# Altium footprint library Library.PcbLib: 298 footprints (part 4 of 19)
Each footprint in its own frame and in the unit in brackets; x right, y up, seen from the top. Pads: shape width x height; smd on the part's side, far side on the other; paste and mask are expansions set on the pad; w line width, h text height; cw(c..) or ccw(c..) is an arc to the next point about the centre after c.
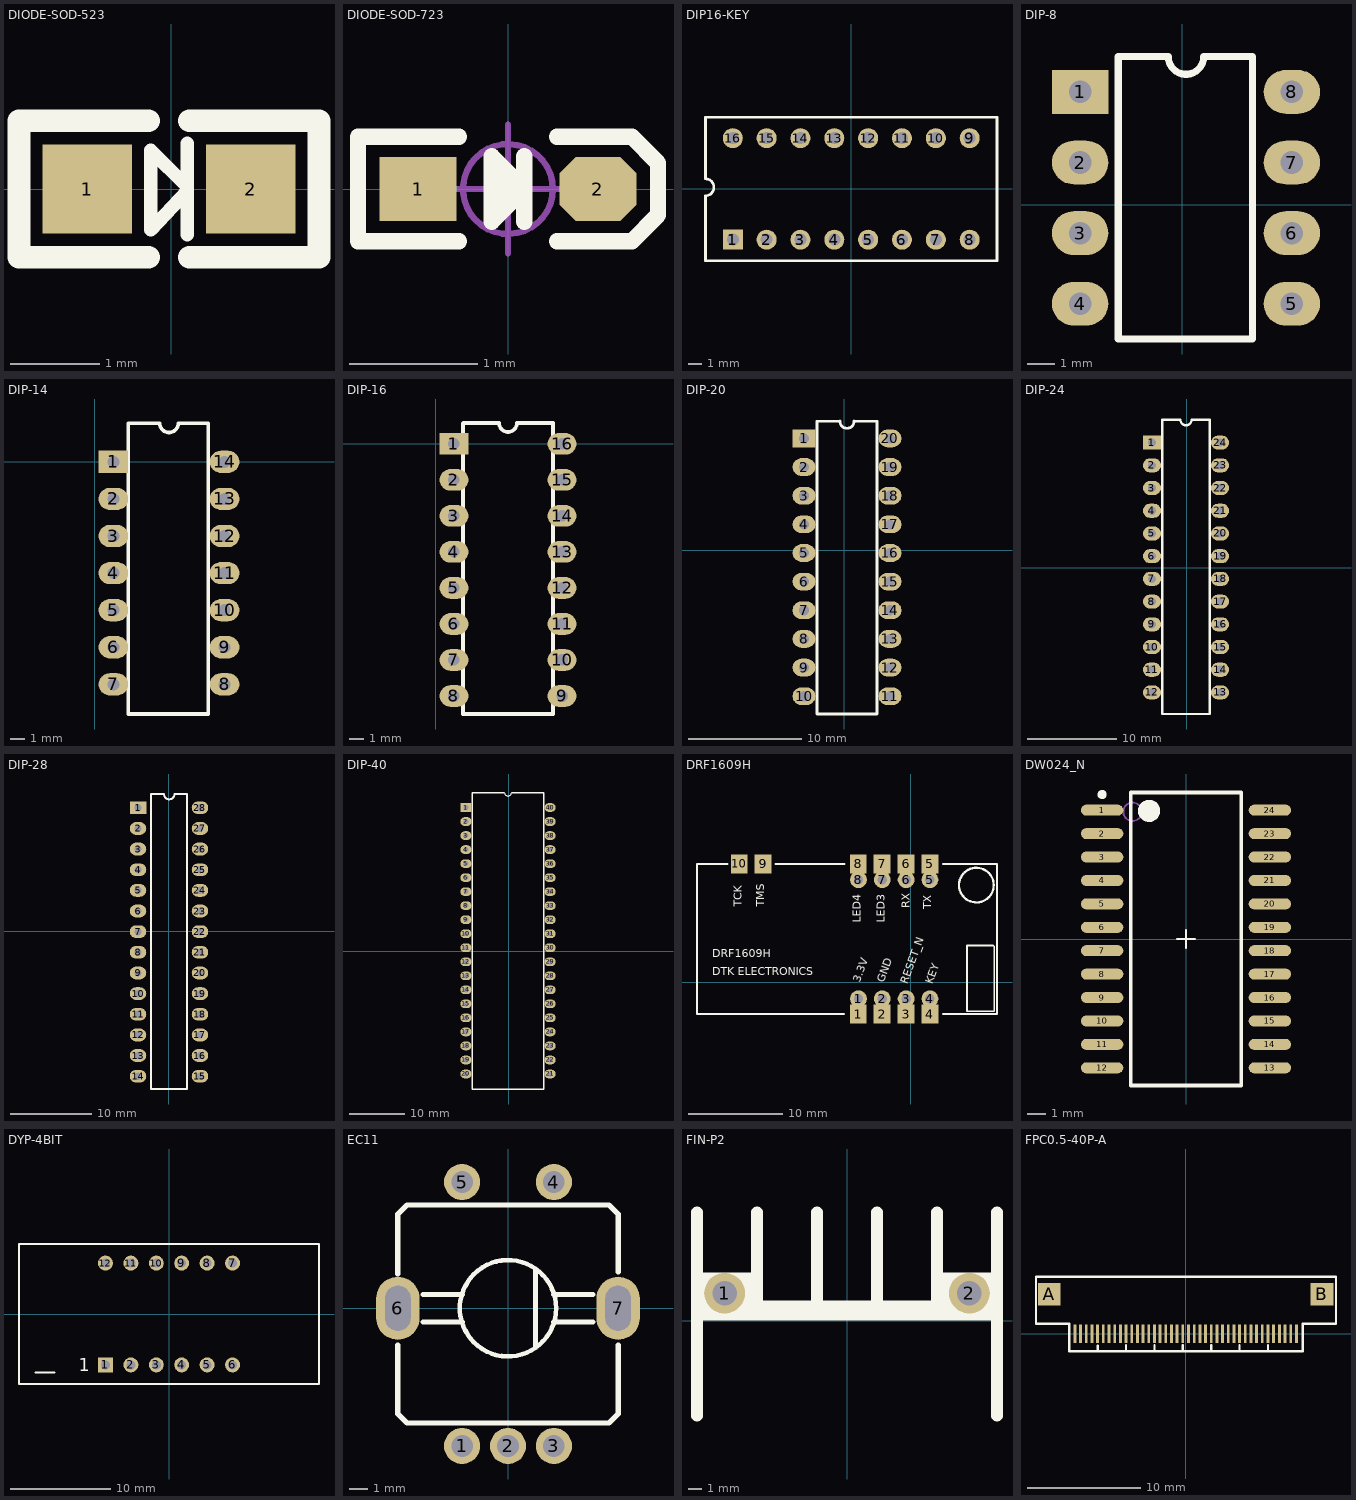
[diagram p3: the footprints below, top view; thin cyan lines are the x and y axes]

## DIODE-SOD-523 [mm] "0603"
pads (2):
  rect 1x1 smd: 1(-0.94,0) 2(0.889,0)
Top Overlay:
  lines w0.152: 0.178,-0.508 0.178,0.508 ; 0.178,-0.025 -0.229,-0.457 -0.229,0.432 0.178,0.025
  lines w0.254: -0.254,-0.762 -1.702,-0.762 -1.702,0.762 -0.254,0.762 ; 0.203,-0.762 1.651,-0.762 1.651,0.762 0.203,0.762
3D body "SOD-523.STEP": height 0.65, standoff 0, extent -0.813,-0.381 0.787,0.419

## DIODE-SOD-723 [mm]
pads (2):
  rect 0.6x0.5 smd: 1(-0.7,0)
  oct 0.6x0.5 smd: 2(0.7,0)
Top Overlay:
  lines w0.127: -0.381,-0.406 -1.168,-0.406 -1.168,0.406 -0.381,0.406 ; 0,-0.127 0,0.127 -0.127,0.254 ; 0.127,-0.254 0.127,0.254 ; 0.381,-0.406 0.965,-0.406 1.168,-0.203 1.168,0.203 0.965,0.406 0.381,0.406 ; -0.127,0.254 -0.127,-0.254 0.127,0 -0.127,0.254
Mechanical 15:
  circle w0.05: c0,0 r0.35
  lines w0.05: -0.5,0 0.5,0 ; 0,-0.5 0,0.5
3D body "SOD-723.STEP": height 0.53, standoff 0.03, extent -0.7,-0.3 0.7,0.3

## DIP16-KEY [mm] "DIP拨码开关"
height 2.65
pads (16):
  rect 1.5x1.5 hole 0.9: 1(-8.89,-3.81)
  round 1.5 hole 0.9: 2(-6.35,-3.81) 3(-3.81,-3.81) 4(-1.27,-3.81) 5(1.27,-3.81) 6(3.81,-3.81) 7(6.35,-3.81) 8(8.89,-3.81) 9(8.89,3.81) 10(6.35,3.81) 11(3.81,3.81) 12(1.27,3.81) 13(-1.27,3.81) 14(-3.81,3.81) 15(-6.35,3.81) 16(-8.89,3.81)
Top Overlay:
  lines w0.2: -10.94,0.76 cw(c-10.94,0.125) -10.94,-0.51 -10.94,-5.4 10.94,-5.4 10.94,5.39 -10.94,5.39 -10.94,0.79

## DIP-8 [mil]
pads (8):
  rect 80x62 / inner rect 100x50 / far side rect 80x62 hole 32: 1(-144.37,159.75)
  oval 80x62 / inner oval 100x50 / far side oval 80x62 hole 32: 2(-144.37,59.75) 3(-144.37,-40.25) 4(-144.37,-140.25) 5(155.63,-140.25) 6(155.63,-40.25) 7(155.63,59.75) 8(155.63,159.75)
Top Overlay:
  lines w10: -90.37,-190.25 -90.37,209.75 -19.37,209.75 ccw(c5.63,209.75) 30.63,209.75 99.63,209.75 99.63,-190.25 -90.37,-190.25
3D body "P0008A.stp": height 147.5, standoff -150.77, extent -157.36,-174.75 165.63,190.25

## DIP-14 [mil]
pads (14):
  rect 80x60 hole 32: 1(50,0)
  oval 80x60 hole 32: 2(50,-100) 3(50,-200) 7(50,-600) 8(350,-600) 9(350,-500) 10(350,-400) 11(350,-300) 12(350,-200) 13(350,-100) 14(350,0)
  oval 80x60 / inner oval 100x50 / far side oval 80x62 hole 32: 4(50,-300) 5(50,-400) 6(50,-500)
Top Overlay:
  lines w10: 175,102 173,104 90,104 90,-680 306,-680 306,104 225,104 cw(c200,104) 175,104
3D body "SW3dPS-DIP14-300.STEP": height 200, standoff -98.03, extent 50.16,-675.86 360,91.86

## DIP-16 [mil]
pads (16):
  rect 80x60 / inner rect 100x50 / far side rect 80x60 hole 32: 1(50,0)
  oval 80x60 / inner oval 100x50 / far side oval 80x60 hole 32: 2(50,-100) 3(50,-200) 4(50,-300) 5(50,-400) 6(50,-500) 7(50,-600) 8(50,-700) 9(350,-700) 10(350,-600) 11(350,-500) 12(350,-400) 13(350,-300) 14(350,-200) 15(350,-100) 16(350,0)
Top Overlay:
  lines w10: 174,58 76,58 75,57 75,-750 325,-750 325,58 ; 175,58 ccw(c200,58) 225,58 ; 226,58 324,58
3D body "SW3dPS-DIP16-300.STEP": height 200, standoff -98.03, extent 42.16,-743.7 352,43.7

## DIP-20 [mil]
pads (20):
  rect 80x62 hole 35.43: 1(-141,390)
  oval 80x62 hole 35.43: 2(-141,290) 3(-141,190) 4(-141,90) 5(-141,-10) 6(-141,-110) 7(-141,-210) 8(-141,-310) 9(-141,-410) 10(-141,-510) 11(159,-510) 12(159,-410) 13(159,-310) 14(159,-210) 15(159,-110) 16(159,-10) 17(159,90) 18(159,190) 19(159,290) 20(159,390)
Top Overlay:
  lines w10: -16,450 -95.33,450 -95.33,-572 113.33,-572 113.33,450 34,450 ; -16,450.13 ccw(c9,450.13) 34,450.13
3D body "User Library-DIP20-300-metric.STEP": height 177.17, standoff -137.8, extent -140.77,-565.87 164.77,442

## DIP-24 [mil]
pads (24):
  rect 80x62 hole 35.43: 1(-153,551)
  oval 80x62 hole 35.43: 2(-153,451) 3(-153,351) 4(-153,251) 5(-153,151) 6(-153,51) 7(-153,-49) 8(-153,-149) 9(-153,-249) 10(-153,-349) 11(-153,-449) 12(-153,-549) 13(147,-549) 14(147,-449) 15(147,-349) 16(147,-249) 17(147,-149) 18(147,-49) 19(147,51) 20(147,151) 21(147,251) 22(147,351) 23(147,451) 24(147,551)
Top Overlay:
  lines w10: -107.33,652 -107.33,-644 102,-644 102,652 22,652 cw(c-3,652) -28,652 -106,652
3D body "SW3dPS-DIP24-300.STEP": height 200, standoff -98.03, extent -158,-634.08 151.84,636

## DIP-28 [mil]
pads (28):
  rect 80x62 hole 35.43: 1(-148,598)
  oval 80x62 hole 35.43: 2(-148,498) 3(-148,398) 4(-148,298) 5(-148,198) 6(-148,98) 7(-148,-2) 8(-148,-102) 9(-148,-202) 10(-148,-302) 11(-148,-402) 12(-148,-502) 13(-148,-602) 14(-148,-702) 15(152,-702) 16(152,-602) 17(152,-502) 18(152,-402) 19(152,-302) 20(152,-202) 21(152,-102) 22(152,-2) 23(152,98) 24(152,198) 25(152,298) 26(152,398) 27(152,498) 28(152,598)
Top Overlay:
  lines w10: -23,664 -85.6,664 -85.6,-764 89.6,-764 89.6,662.4 88,664 28,664 cw(c3,664) -22,664
3D body "SW3dPS-DIP28-300.STEP": height 200, standoff -98.03, extent -149.84,-760.66 160,656.66

## DIP-40 [mil]
pads (40):
  rect 80x62 hole 35.43: 1(-304,1025)
  oval 80x62 hole 35.43: 2(-304,925) 3(-304,825) 4(-304,725) 5(-304,625) 6(-304,525) 7(-304,425) 8(-304,325) 9(-304,225) 10(-304,125) 11(-304,25) 12(-304,-75) 13(-304,-175) 14(-304,-275) 15(-304,-375) 16(-304,-475) 17(-304,-575) 18(-304,-675) 19(-304,-775) 20(-304,-875) 21(296,-875) 22(296,-775) 23(296,-675) 24(296,-575) 25(296,-475) 26(296,-375) 27(296,-275) 28(296,-175) 29(296,-75) 30(296,25) 31(296,125) 32(296,225) 33(296,325) 34(296,425) 35(296,525) 36(296,625) 37(296,725) 38(296,825) 39(296,925) 40(296,1025)
Top Overlay:
  lines w7.87: -29,1132.09 ccw(c-4,1132.09) 21,1132.09
  lines w10: -29,1132.09 -257.94,1132.09 -257.94,-982.09 249.94,-982.09 249.94,1132.09 21,1132.09
3D body "SW3dPS-DIP40-600.STEP": height 224.41, standoff -101.57, extent -305.84,-944.48 304,1120.48

## DRF1609H [mm]
pads (18):
  rect 1.8x2 smd: 1(-5.607,-3.377) 2(-3.057,-3.377) 3(-0.507,-3.377) 4(2.043,-3.377) 5(2.043,12.623) 6(-0.507,12.623) 7(-3.057,12.623) 8(-5.607,12.623) 9(-15.757,12.623) 10(-18.307,12.623)
  round 1.8 hole 1: 1(-5.582,-1.753) 2(-3.042,-1.753) 3(-0.502,-1.753) 4(2.038,-1.753) 5(2.038,10.947) 6(-0.502,10.947) 7(-3.042,10.947) 8(-5.582,10.947)
Top Overlay:
  circle w0.25: c6.992,10.373 r1.851
  lines w0.2: -19.557,12.623 -22.807,12.623 -22.807,-3.377 -9.507,-3.377 -7.132,-3.377 ; -14.457,12.623 -7.057,12.623 ; 3.443,-3.377 9.193,-3.377 9.193,12.623 3.443,12.623 ; 5.993,3.823 5.993,-3.077 8.893,-3.077 8.893,3.823 ; 5.993,3.923 8.793,3.923
  text "TCK" at -17.729,8.052 h1.5
  text "TMS" at -15.316,8.052 h1.5
  text "DRF1609H" at -21.158,2.337 h1.5
  text "DTK ELECTRONICS" at -21.158,0.432 h1.5
  text "3.3V" at -5.131,-0.229 h1.5
  text "GND" at -2.591,-0.229 h1.5
  text "RESET_N" at -0.051,-0.356 h1.5
  text "KEY" at 2.616,-0.356 h1.5
  text "TX" at 2.489,7.772 h1.5
  text "RX" at 0.203,7.899 h1.5
  text "LED3" at -2.464,6.375 h1.5
  text "LED4" at -5.004,6.375 h1.5

## DW024_N [mm] "74hc154"
height 2.65
pads (24):
  oval 2.3x0.6 smd: 1(-4.55,6.985) 2(-4.55,5.715) 3(-4.55,4.445) 4(-4.55,3.175) 5(-4.55,1.905) 6(-4.55,0.635) 7(-4.55,-0.635) 8(-4.55,-1.905) 9(-4.55,-3.175) 10(-4.55,-4.445) 11(-4.55,-5.715) 12(-4.55,-6.985) 13(4.55,-6.985) 14(4.55,-5.715) 15(4.55,-4.445) 16(4.55,-3.175) 17(4.55,-1.905) 18(4.55,-0.635) 19(4.55,0.635) 20(4.55,1.905) 21(4.55,3.175) 22(4.55,4.445) 23(4.55,5.715) 24(4.55,6.985)
Top Overlay:
  circle w0.25: c-4.55,7.835 r0.125
  circle w0.6: c-2,6.95 r0.3
  lines w0.1: -0.5,0 0.5,0 ; 0,-0.5 0,0.5
  lines w0.2: -3,-7.95 -3,7.95 3,7.95 3,-7.95 -3,-7.95
Mechanical 13:
  circle w0.1: c-2.9,6.9 r0.5
3D body: height 2.65, standoff 0, extent -3.8,-7.8 3.8,7.8

## DYP-4BIT [mm] "数码管"
height 1.2
pads (12):
  rect 1.5x1.5 hole 0.9: 1(-6.35,-5.08)
  round 1.5 hole 0.9: 2(-3.81,-5.08) 3(-1.27,-5.08) 4(1.27,-5.08) 5(3.81,-5.08) 6(6.35,-5.08) 7(6.35,5.08) 8(3.81,5.08) 9(1.27,5.08) 10(-1.27,5.08) 11(-3.81,5.08) 12(-6.35,5.08)
Top Overlay:
  lines w0.2: -13.335,-5.842 -11.43,-5.842 ; -14.986,-6.985 14.986,-6.985 14.986,6.985 -14.986,6.985 -14.986,-6.985
  text "1" at -9.017,-5.715 h1.27

## EC11 [mm]
pads (7):
  round 2 hole 1.2: 1(-2.54,-7.62) 2(0,-7.62) 3(2.54,-7.62) 4(2.54,6.985) 5(-2.54,6.985)
  oval 2.4x3.5 hole 1.4 slot 2.5 at 90 deg: 6(-6.096,0) 7(6.096,0)
Top Overlay:
  circle w0.254: c0,0 r2.667
  lines w0.3: -6.096,-2.032 -6.096,-5.842 -5.588,-6.35 5.588,-6.35 6.096,-5.842 6.096,-2.032 ; -6.096,1.905 -6.096,5.207 -5.588,5.715 5.588,5.715 6.096,5.207 6.096,2.032 ; -4.699,-0.762 -2.54,-0.762 ; -4.699,0.762 -2.54,0.762 ; 1.524,-2.159 1.524,2.159 ; 2.54,-0.762 4.699,-0.762 ; 2.54,0.762 4.699,0.762
3D body "SW3dPS-Encoder Alpha RE111F-41B3N-15F-20P.STEP": height 21.35, standoff -3.13, extent -6.847,-7.718 6.807,7.112

## FIN-P2 [mm] "散热片"
height 1.9
pads (2):
  round 3 hole 1.8: 1(-9.017,2.032) 2(9.017,2.032)
Top Overlay:
  rectangle: -11.049,0.889 -6.629,3.556
  rectangle: 6.629,1.27 11.049,3.556
  lines w0.85: -11.049,-7 -11.049,8 ; -6.629,0.762 -6.629,8.001 ; -2.21,0.762 -2.21,8.001 ; 2.21,0.762 2.21,8.001 ; 6.629,0.762 6.629,8.001 ; 11.049,-7 11.049,8
  lines w1.5: -10.668,0.762 10.668,0.762

## FPC0.5-40P-A [mm]
height 1
pads (42):
  rect 0.25x1.6 smd: 1(-9.78,0.011) 2(-9.28,0.011) 3(-8.78,0.011) 4(-8.28,0.011) 5(-7.78,0.011) 6(-7.28,0.011) 7(-6.78,0.011) 8(-6.28,0.011) 9(-5.78,0.011) 10(-5.28,0.011) 11(-4.78,0.011) 12(-4.28,0.011) 13(-3.78,0.011) 14(-3.28,0.011) 15(-2.78,0.011) 16(-2.28,0.011) 17(-1.78,0.011) 18(-1.28,0.011) 19(-0.78,0.011) 20(-0.28,0.011) 21(0.22,0.011) 22(0.72,0.011) 23(1.22,0.011) 24(1.72,0.011) 25(2.22,0.011) 26(2.72,0.011) 27(3.22,0.011) 28(3.72,0.011) 29(4.22,0.011) 30(4.72,0.011) 31(5.22,0.011) 32(5.72,0.011) 33(6.22,0.011) 34(6.72,0.011) 35(7.22,0.011) 36(7.72,0.011) 37(8.22,0.011) 38(8.72,0.011) 39(9.22,0.011) 40(9.72,0.011)
  rect 2x2 smd: A(-12.029,3.5) B(11.971,3.5)
Top Overlay:
  lines w0.2: -10.287,-1.524 -10.287,0.889 -13.208,0.889 -13.208,5.036 13.208,5.036 13.208,1.27 13.208,0.889 10.287,0.889 10.287,-1.514 -10.287,-1.514 ; -7.78,-1.514 -7.78,-1.014 ; -5.28,-1.514 -5.28,-0.989 ; -2.78,-1.489 -2.78,-0.989 ; -0.28,-1.464 -0.28,-0.964 ; 2.22,-1.464 2.22,-0.964 ; 4.72,-1.464 4.72,-0.964 ; 7.22,-1.464 7.22,-0.964